# Altium footprint library Metric_Thru_Hole.PcbLib: 91 footprints (part 2 of 6)
Each footprint in its own frame and in the unit in brackets; x right, y up, seen from the top. Pads: shape width x height; smd on the part's side, far side on the other; paste and mask are expansions set on the pad; w line width, h text height; cw(c..) or ccw(c..) is an arc to the next point about the centre after c.
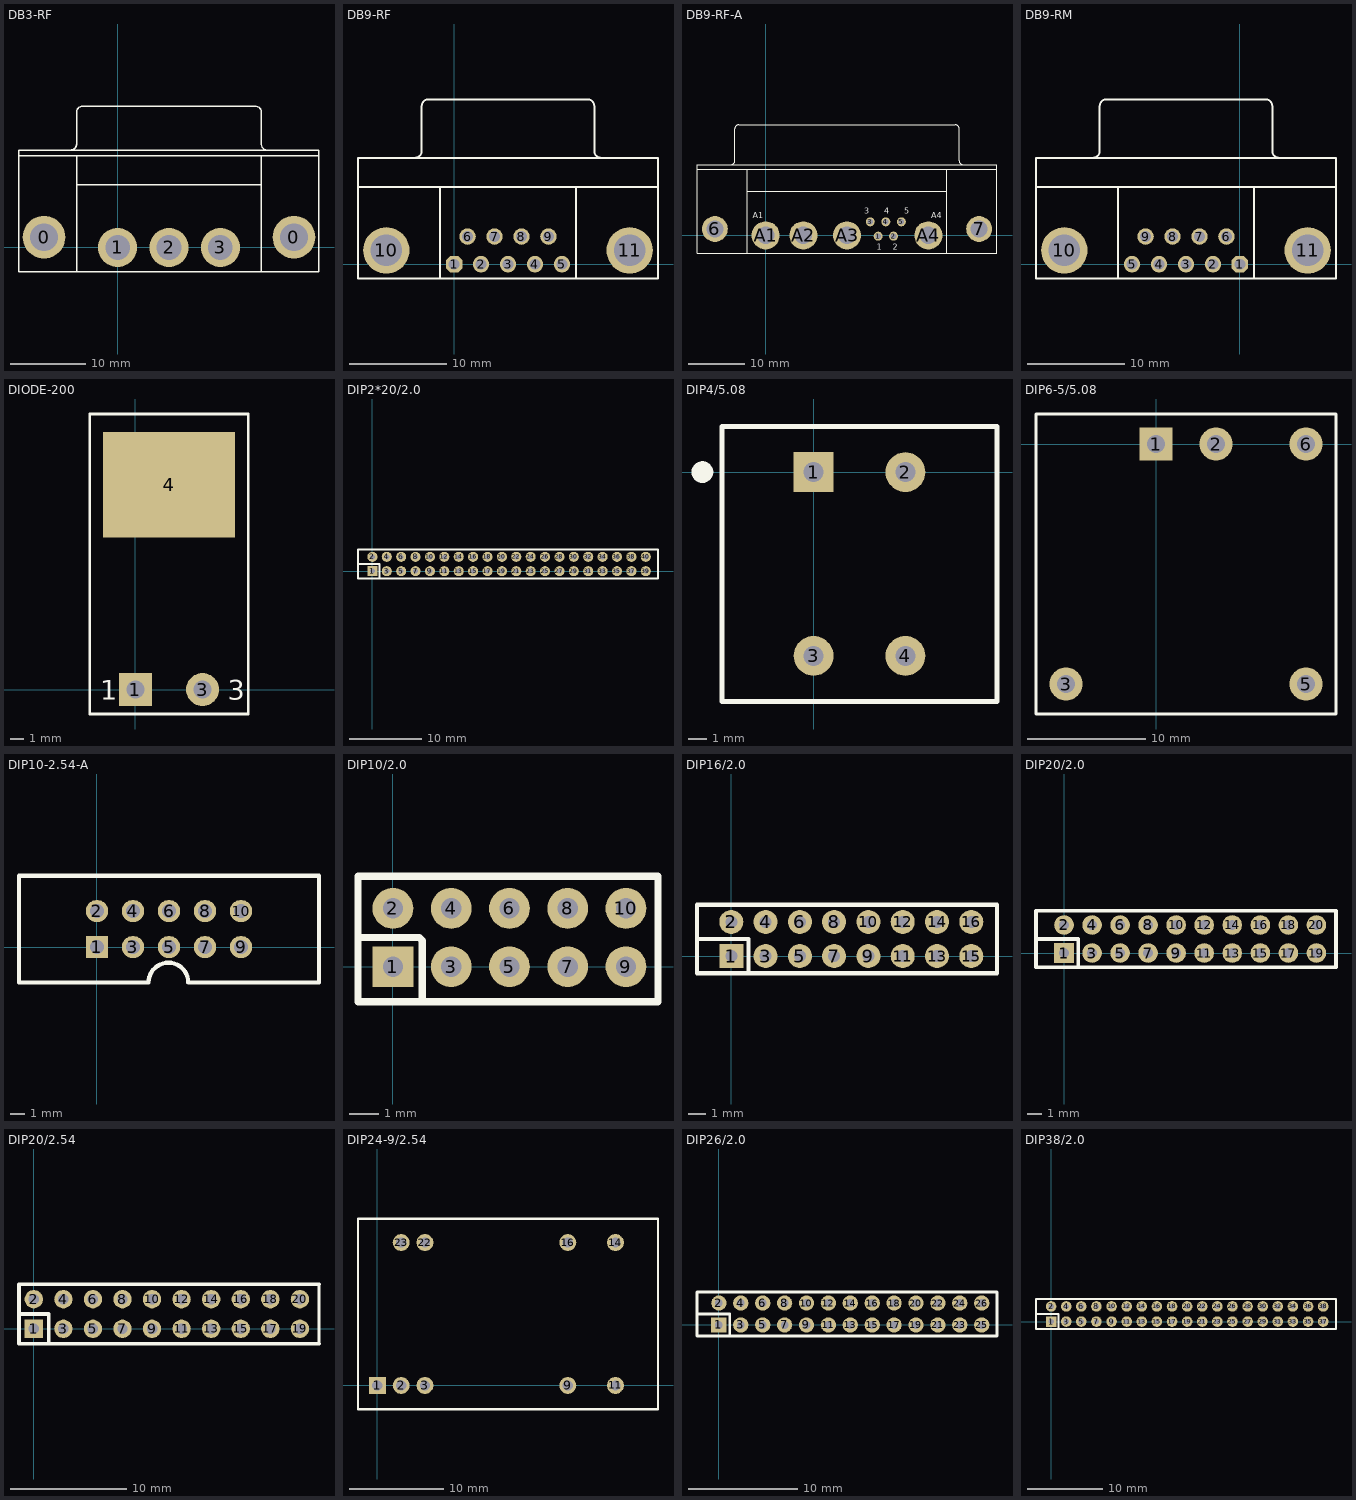
[diagram p1: the footprints below, top view; thin cyan lines are the x and y axes]

## DB3-RF [mm] "D-SUB 3W3 弯脚,母座，pitch 6.86mm,"
height 12.88
pads (5):
  round 5.7 hole 3.7: 0(-9.8,1.38) 0(23.52,1.38)
  round 5.2 hole 3.28: 1(0,0) 2(6.86,0) 3(13.72,0)
Top Overlay:
  lines w0.2: -13.14,12.2 26.86,12.2 ; -6.165,13.021 ccw(c-6.165,13.716) -5.47,13.716 -5.47,18.105 cw(c-4.775,18.105) -4.775,18.8 ; -5.47,-3.2 -5.47,12.192 ; -5.47,8.34 19.19,8.34 ; -4.824,18.8 18.495,18.8 cw(c18.495,18.105) 19.19,18.105 19.19,13.695 ccw(c19.885,13.695) 19.885,13 ; 19.19,-3.2 19.19,12.2 ; -13.14,-3.2 26.86,-3.2 26.86,13 -13.14,13 -13.14,-3.2

## DB9-RF [mm] "DB9 卧式间距1.385 mm,母头"
height 12.75
pads (11):
  oct 1.69x1.69 hole 1.09: 1(0,0)
  round 1.69 hole 1.09: 2(2.77,0) 3(5.54,0) 4(8.31,0) 5(11.08,0) 6(1.385,2.84) 7(4.155,2.84) 8(6.925,2.84) 9(9.695,2.84)
  round 4.76 hole 3.26: 10(-6.955,1.42) 11(18.035,1.42)
Top Overlay:
  lines w0.2: -9.86,7.92 20.94,7.92 ; -4.02,10.925 ccw(c-4.02,11.62) -3.325,11.62 -3.325,16.22 ; -3.32,16.225 cw(c-2.625,16.225) -2.625,16.92 13.705,16.92 cw(c13.705,16.225) 14.4,16.225 ; -1.46,-1.48 -1.46,7.92 ; 12.54,-1.48 12.54,7.92 ; 14.405,16.22 14.405,11.62 ccw(c15.1,11.62) 15.1,10.925 ; -9.86,-1.48 -9.86,10.92 20.94,10.92 20.94,-1.48 -9.86,-1.48
Bottom Overlay:
  text "8" at 7.137,4.115 h1
  text "7" at 4.343,4.064 h1
  text "4" at 8.661,-2.337 h1
  text "3" at 5.715,-2.286 h1
  text "2" at 2.946,-2.184 h1
  text "6" at 1.73,4.062 h1
  text "9" at 10.112,4.062 h1
  text "1" at 0,1.27 h1
  text "5" at 11.684,1.27 h1
3D body "SW3DPS-DB9RA_F-DEFAULT.STEP": height 12.55, standoff -3.5, extent -10.067,-1.636 21.243,16.764

## DB9-RF-A [mm] "DB9 卧式间距1.385 mm,母头"
height 12.75
pads (11):
  round 1.6 hole 1: 1(20.02,-0.14) 2(22.76,-0.14) 3(18.62,2.4) 4(21.39,2.4) 5(24.16,2.4)
  round 4.6 hole 3: 6(-9.04,1.13) 7(38,1.13)
  round 5 hole 3.15: A1(0,0) A2(6.71,0) A3(14.48,0) A4(28.96,0)
Top Overlay:
  lines w0.2: -12.22,11.8 41.18,11.8 ; -6.16,12.6 ccw(c-6.16,13.295) -5.465,13.295 -5.465,19.005 cw(c-4.77,19.005) -4.77,19.7 33.73,19.7 cw(c33.73,19.005) 34.425,19.005 34.425,13.295 ccw(c35.12,13.295) 35.12,12.6 ; -3.3,-3.2 -3.3,11.8 ; -3.3,7.874 32.26,7.874 ; 32.26,-3.2 32.26,11.8 ; -12.22,-3.2 41.18,-3.2 41.18,12.6 -12.22,12.6 -12.22,-3.2
  text "A4" at 29.464,3.048 h1.02
  text "A1" at -2.286,3.048 h1.02
  text "4" at 21.082,3.81 h1.02
  text "5" at 24.638,3.81 h1.02
  text "3" at 17.526,3.81 h1.02
  text "2" at 22.606,-2.54 h1.02
  text "1" at 19.812,-2.54 h1.02

## DB9-RM [mm] "DB9 卧式间距1.385 mm,公头"
height 12.75
pads (11):
  oct 1.69x1.69 hole 1.09: 1(0,0)
  round 1.69 hole 1.09: 2(-2.77,0) 3(-5.54,0) 4(-8.31,0) 5(-11.08,0) 6(-1.385,2.84) 7(-4.155,2.84) 8(-6.925,2.84) 9(-9.695,2.84)
  round 4.76 hole 3.26: 10(-18.035,1.42) 11(6.955,1.42)
Top Overlay:
  lines w0.2: -20.94,7.92 9.86,7.92 ; -15.1,10.925 ccw(c-15.1,11.62) -14.405,11.62 -14.405,16.22 ; -14.4,16.225 cw(c-13.705,16.225) -13.705,16.92 2.625,16.92 cw(c2.625,16.225) 3.32,16.225 ; -12.54,-1.48 -12.54,7.92 ; 1.46,-1.48 1.46,7.92 ; 3.325,16.22 3.325,11.62 ccw(c4.02,11.62) 4.02,10.925 ; -20.94,-1.48 -20.94,10.92 9.86,10.92 9.86,-1.48 -20.94,-1.48
Bottom Overlay:
  text "6" at -0.968,4.062 h1
  text "9" at -9.35,4.062 h1
  text "1" at 0.254,1.27 h1
  text "5" at -10.922,1.27 h1
  text "4" at -7.95,-2.286 h1
  text "3" at -5.283,-2.311 h1
  text "2" at -2.413,-2.311 h1
  text "7" at -3.988,4.062 h1
  text "8" at -6.756,4.062 h1
3D body "SW3DPS-DB9RA_M-DEFAULT.STEP": height 12.55, standoff -3.5, extent -21.245,-1.524 10.069,17.276

## DIODE-200 [mm]
height 4.82
pads (3):
  rect 2.5x2.5 hole 1.35: 1(0,0)
  round 2.5 hole 1.35: 3(5.08,0)
  rect 10x8 smd: 4(2.54,15.5)
Top Overlay:
  lines w0.2: -3.46,-1.85 -3.46,2.85 -3.46,20.859 8.54,20.859 8.54,2.85 8.54,-1.85 7.112,-1.85 -1.905,-1.85 -3.46,-1.85
  text "3" at 6.985,-0.762 h1.5
  text "1" at -2.667,-0.762 h1.5

## DIP2*20/2.0 [mm]
pads (40):
  rect 1.4x1.4 hole 0.7: 1(0,0)
  round 1.4 hole 0.7: 2(0,2) 3(2,0) 4(2,2) 5(4,0) 6(4,2) 7(6,0) 8(6,2) 9(8,0) 10(8,2) 11(10,0) 12(10,2) 13(12,0) 14(12,2) 15(14,0) 16(14,2) 17(16,0) 18(16,2) 19(18,0) 20(18,2) 21(20,0) 22(20,2) 23(22,0) 24(22,2) 25(24,0) 26(24,2) 27(26,0) 28(26,2) 29(28,0) 30(28,2) 31(30,0) 32(30,2) 33(32,0) 34(32,2) 35(34,0) 36(34,2) 37(36,0) 38(36,2) 39(38,0) 40(38,2)
Top Overlay:
  lines w0.254: -2,1 1,1 1,-1 ; -2,-1 -2,3 39.7,3 39.7,-1 -2,-1
3D body: height 5.59, standoff 0.51, extent 37.748,-0.253 38.255,0.252
3D body: height 1.02, standoff 0, extent 36.73,-1.27 39.265,1.26
3D body: height 1.02, standoff 0, extent 36.73,0.762 39.265,3.292
3D body: height 5.59, standoff 0.51, extent 37.748,1.779 38.255,2.284
3D body: height 5.59, standoff 0.51, extent 35.748,-0.253 36.255,0.252
3D body: height 1.02, standoff 0, extent 34.73,-1.27 37.265,1.26
3D body: height 1.02, standoff 0, extent 34.73,0.762 37.265,3.292
3D body: height 5.59, standoff 0.51, extent 35.748,1.779 36.255,2.284
3D body: height 5.59, standoff 0.51, extent 33.748,-0.253 34.255,0.252
3D body: height 1.02, standoff 0, extent 32.73,-1.27 35.265,1.26
3D body: height 1.02, standoff 0, extent 32.73,0.762 35.265,3.292
3D body: height 5.59, standoff 0.51, extent 33.748,1.779 34.255,2.284
3D body: height 5.59, standoff 0.51, extent 31.748,-0.253 32.255,0.252
3D body: height 1.02, standoff 0, extent 30.73,-1.27 33.265,1.26
3D body: height 1.02, standoff 0, extent 30.73,0.762 33.265,3.292
3D body: height 5.59, standoff 0.51, extent 31.748,1.779 32.255,2.284
3D body: height 5.59, standoff 0.51, extent 29.748,-0.253 30.255,0.252
3D body: height 1.02, standoff 0, extent 28.73,-1.27 31.265,1.26
3D body: height 1.02, standoff 0, extent 28.73,0.762 31.265,3.292
3D body: height 5.59, standoff 0.51, extent 29.748,1.779 30.255,2.284
3D body: height 5.59, standoff 0.51, extent 27.748,-0.253 28.255,0.252
3D body: height 1.02, standoff 0, extent 26.73,-1.27 29.265,1.26
3D body: height 1.02, standoff 0, extent 26.73,0.762 29.265,3.292
3D body: height 5.59, standoff 0.51, extent 27.748,1.779 28.255,2.284
3D body: height 5.59, standoff 0.51, extent 25.748,-0.253 26.255,0.252
3D body: height 1.02, standoff 0, extent 24.73,-1.27 27.265,1.26
3D body: height 1.02, standoff 0, extent 24.73,0.762 27.265,3.292
3D body: height 5.59, standoff 0.51, extent 25.748,1.779 26.255,2.284
3D body: height 5.59, standoff 0.51, extent 23.748,-0.253 24.255,0.252
3D body: height 1.02, standoff 0, extent 22.73,-1.27 25.265,1.26
3D body: height 1.02, standoff 0, extent 22.73,0.762 25.265,3.292
3D body: height 5.59, standoff 0.51, extent 23.748,1.779 24.255,2.284
3D body: height 5.59, standoff 0.51, extent 21.748,-0.253 22.255,0.252
3D body: height 1.02, standoff 0, extent 20.73,-1.27 23.265,1.26
3D body: height 1.02, standoff 0, extent 20.73,0.762 23.265,3.292
3D body: height 5.59, standoff 0.51, extent 21.748,1.779 22.255,2.284
3D body: height 5.59, standoff 0.51, extent 19.748,-0.253 20.255,0.252
3D body: height 1.02, standoff 0, extent 18.73,-1.27 21.265,1.26
3D body: height 1.02, standoff 0, extent 18.73,0.762 21.265,3.292
3D body: height 5.59, standoff 0.51, extent 19.748,1.779 20.255,2.284
3D body: height 5.59, standoff 0.51, extent 17.748,-0.253 18.255,0.252
3D body: height 1.02, standoff 0, extent 16.73,-1.27 19.265,1.26
3D body: height 1.02, standoff 0, extent 16.73,0.762 19.265,3.292
3D body: height 5.59, standoff 0.51, extent 17.748,1.779 18.255,2.284
3D body: height 5.59, standoff 0.51, extent 15.748,-0.253 16.255,0.252
3D body: height 1.02, standoff 0, extent 14.73,-1.27 17.265,1.26
3D body: height 1.02, standoff 0, extent 14.73,0.762 17.265,3.292
3D body: height 5.59, standoff 0.51, extent 15.748,1.779 16.255,2.284
3D body: height 5.59, standoff 0.51, extent 13.748,-0.253 14.255,0.252
3D body: height 1.02, standoff 0, extent 12.73,-1.27 15.265,1.26
3D body: height 1.02, standoff 0, extent 12.73,0.762 15.265,3.292
3D body: height 5.59, standoff 0.51, extent 13.748,1.779 14.255,2.284
3D body: height 5.59, standoff 0.51, extent 11.748,-0.253 12.255,0.252
3D body: height 1.02, standoff 0, extent 10.73,-1.27 13.265,1.26
3D body: height 1.02, standoff 0, extent 10.73,0.762 13.265,3.292
3D body: height 5.59, standoff 0.51, extent 11.748,1.779 12.255,2.284
3D body: height 5.59, standoff 0.51, extent 9.748,-0.253 10.255,0.252
3D body: height 1.02, standoff 0, extent 8.73,-1.27 11.265,1.26
3D body: height 1.02, standoff 0, extent 8.73,0.762 11.265,3.292
3D body: height 5.59, standoff 0.51, extent 9.748,1.779 10.255,2.284
3D body: height 5.59, standoff 0.51, extent 7.748,-0.253 8.255,0.252
3D body: height 1.02, standoff 0, extent 6.73,-1.27 9.265,1.26
3D body: height 1.02, standoff 0, extent 6.73,0.762 9.265,3.292
3D body: height 5.59, standoff 0.51, extent 7.748,1.779 8.255,2.284
3D body: height 5.59, standoff 0.51, extent 5.748,-0.253 6.255,0.252
3D body: height 1.02, standoff 0, extent 4.73,-1.27 7.265,1.26
3D body: height 1.02, standoff 0, extent 4.73,0.762 7.265,3.292
3D body: height 5.59, standoff 0.51, extent 5.748,1.779 6.255,2.284
3D body: height 5.59, standoff 0.51, extent 3.748,-0.253 4.255,0.252
3D body: height 1.02, standoff 0, extent 2.73,-1.27 5.265,1.26
3D body: height 1.02, standoff 0, extent 2.73,0.762 5.265,3.292
3D body: height 5.59, standoff 0.51, extent 3.748,1.779 4.255,2.284
3D body: height 5.59, standoff 0.51, extent 1.748,-0.253 2.255,0.252
3D body: height 1.02, standoff 0, extent 0.73,-1.27 3.265,1.26
3D body: height 1.02, standoff 0, extent 0.73,0.762 3.265,3.292
3D body: height 5.59, standoff 0.51, extent 1.748,1.779 2.255,2.284
3D body: height 5.59, standoff 0.51, extent -0.252,-0.253 0.255,0.252
3D body: height 1.02, standoff 0, extent -1.27,-1.27 1.265,1.26
3D body: height 1.02, standoff 0, extent -1.27,0.762 1.265,3.292
3D body: height 5.59, standoff 0.51, extent -0.252,1.779 0.255,2.284

## DIP4/5.08 [mm] "lcm"
height 11
pads (4):
  rect 2.2x2.2 hole 1.1: 1(0,0)
  round 2.2 hole 1.1: 2(5.08,0) 3(0,-10.16) 4(5.08,-10.16)
Top Overlay:
  circle w0.6: c-6.142,0 r0.3
  lines w0.254: -5.06,-12.68 10.14,-12.68 10.14,2.52 -5.06,2.52 -5.06,-12.68

## DIP6-5/5.08 [mm]
height 11.7
pads (5):
  rect 2.8x2.8 hole 1.5: 1(0,0)
  round 2.8 hole 1.5: 2(5.08,0) 3(-7.62,-20.32) 5(12.7,-20.32) 6(12.7,0)
Top Overlay:
  lines w0.254: -10.16,-22.86 -10.16,2.54 15.24,2.54 15.24,-22.86 -10.16,-22.86

## DIP10-2.54-A [mil]
pads (10):
  rect 62x62 hole 39.37: 1(0,0)
  round 62 hole 39.37: 2(0,100) 3(100,0) 4(100,100) 5(200,0) 6(200,100) 7(300,0) 8(300,100) 9(400,0) 10(400,100)
Top Overlay:
  lines w12: 614.17,198.43 -216.53,198.43 -216.53,-98.42 143.31,-98.42 cw(c198.43,-98.42) 253.54,-98.42 616.53,-98.42 616.53,198.43

## DIP10/2.0 [mm] "间距2.0插针,焊盘:外径1.4mm.孔径0.7mm"
height 5
pads (10):
  rect 1.4x1.4 hole 0.7: 1(0,0)
  round 1.4 hole 0.7: 2(0,2) 3(2,0) 4(2,2) 5(4,0) 6(4,2) 7(6,0) 8(6,2) 9(8,0) 10(8,2)
Top Overlay:
  lines w0.254: -1.2,1 0.9,1 1,0.9 1,-1.2 ; -1.2,-1.2 -1.2,3.1 9.1,3.1 9.1,-1.2 -1.2,-1.2
3D body: height 5.59, standoff 0.51, extent -0.252,1.779 0.254,2.285
3D body: height 5.59, standoff 0.51, extent 1.78,1.779 2.286,2.285
3D body: height 5.59, standoff 0.51, extent 3.812,1.779 4.318,2.285
3D body: height 5.59, standoff 0.51, extent 5.844,1.779 6.35,2.285
3D body: height 5.59, standoff 0.51, extent 7.622,1.779 8.128,2.285
3D body: height 5.59, standoff 0.51, extent 7.876,-0.253 8.382,0.253
3D body: height 5.59, standoff 0.51, extent 5.844,-0.253 6.35,0.253
3D body: height 5.59, standoff 0.51, extent 3.812,-0.253 4.318,0.253
3D body: height 5.59, standoff 0.51, extent 1.78,-0.253 2.286,0.253
3D body: height 1.02, standoff 0, extent -1.27,0.762 1.26,3.297
3D body: height 1.02, standoff 0, extent 0.762,0.762 3.292,3.297
3D body: height 1.02, standoff 0, extent 2.794,0.762 5.324,3.297
3D body: height 1.02, standoff 0, extent 4.826,0.762 7.356,3.297
3D body: height 1.02, standoff 0, extent 6.858,0.762 9.388,3.297
3D body: height 1.02, standoff 0, extent 6.604,-1.27 9.134,1.265
3D body: height 1.02, standoff 0, extent 4.826,-1.27 7.356,1.265
3D body: height 1.02, standoff 0, extent 2.794,-1.27 5.324,1.265
3D body: height 1.02, standoff 0, extent 0.762,-1.27 3.292,1.265
3D body: height 1.02, standoff 0, extent -1.27,-1.27 1.26,1.265
3D body: height 5.59, standoff 0.51, extent -0.252,-0.253 0.254,0.253

## DIP16/2.0 [mm] "间距2.0插针,焊盘:外径1.4mm.孔径0.7mm"
height 5
pads (16):
  rect 1.4x1.4 hole 0.7: 1(0,0)
  round 1.4 hole 0.7: 2(0,2) 3(2,0) 4(2,2) 5(4,0) 6(4,2) 7(6,0) 8(6,2) 9(8,0) 10(8,2) 11(10,0) 12(10,2) 13(12,0) 14(12,2) 15(14,0) 16(14,2)
Top Overlay:
  lines w0.254: -2,1 1,1 1,-1 ; -2,-1 -2,3 15.5,3 15.5,-1 -2,-1
3D body: height 1.02, standoff 0, extent -1.27,-1.27 1.26,1.265
3D body: height 5.59, standoff 0.51, extent -0.252,-0.253 0.254,0.253
3D body: height 1.02, standoff 0, extent 0.73,-1.27 3.26,1.265
3D body: height 5.59, standoff 0.51, extent 1.748,-0.253 2.254,0.253
3D body: height 1.02, standoff 0, extent 2.73,-1.27 5.26,1.265
3D body: height 5.59, standoff 0.51, extent 3.748,-0.253 4.254,0.253
3D body: height 1.02, standoff 0, extent 4.73,-1.27 7.26,1.265
3D body: height 5.59, standoff 0.51, extent 5.748,-0.253 6.254,0.253
3D body: height 1.02, standoff 0, extent 6.73,-1.27 9.26,1.265
3D body: height 5.59, standoff 0.51, extent 7.748,-0.253 8.254,0.253
3D body: height 1.02, standoff 0, extent 8.73,-1.27 11.26,1.265
3D body: height 5.59, standoff 0.51, extent 9.748,-0.253 10.254,0.253
3D body: height 1.02, standoff 0, extent 10.73,-1.27 13.26,1.265
3D body: height 5.59, standoff 0.51, extent 11.748,-0.253 12.254,0.253
3D body: height 1.02, standoff 0, extent 12.73,-1.27 15.26,1.265
3D body: height 5.59, standoff 0.51, extent 13.748,-0.253 14.254,0.253
3D body: height 1.02, standoff 0, extent 12.73,0.73 15.26,3.265
3D body: height 5.59, standoff 0.51, extent 13.748,1.747 14.254,2.254
3D body: height 1.02, standoff 0, extent 10.73,0.73 13.26,3.265
3D body: height 5.59, standoff 0.51, extent 11.748,1.747 12.254,2.254
3D body: height 1.02, standoff 0, extent 8.73,0.73 11.26,3.265
3D body: height 5.59, standoff 0.51, extent 9.748,1.747 10.254,2.254
3D body: height 1.02, standoff 0, extent 6.73,0.73 9.26,3.265
3D body: height 5.59, standoff 0.51, extent 7.748,1.747 8.254,2.254
3D body: height 1.02, standoff 0, extent 4.73,0.73 7.26,3.265
3D body: height 5.59, standoff 0.51, extent 5.748,1.747 6.254,2.254
3D body: height 1.02, standoff 0, extent 2.73,0.73 5.26,3.265
3D body: height 5.59, standoff 0.51, extent 3.748,1.747 4.254,2.254
3D body: height 1.02, standoff 0, extent 0.73,0.73 3.26,3.265
3D body: height 5.59, standoff 0.51, extent 1.748,1.747 2.254,2.254
3D body: height 1.02, standoff 0, extent -1.27,0.73 1.26,3.265
3D body: height 5.59, standoff 0.51, extent -0.252,1.747 0.254,2.254

## DIP20/2.0 [mm] "间距2.0插针,焊盘:外径1.4mm.孔径0.7mm"
height 5
pads (20):
  rect 1.4x1.4 hole 0.7: 1(0,0)
  round 1.4 hole 0.7: 2(0,2) 3(2,0) 4(2,2) 5(4,0) 6(4,2) 7(6,0) 8(6,2) 9(8,0) 10(8,2) 11(10,0) 12(10,2) 13(12,0) 14(12,2) 15(14,0) 16(14,2) 17(16,0) 18(16,2) 19(18,0) 20(18,2)
Top Overlay:
  lines w0.254: -2,1 1,1 1,-1 ; -2,-1 19.4,-1 19.4,3 -2,3 -2,-1
3D body: height 5.59, standoff 0.51, extent -0.252,-0.253 0.254,0.253
3D body: height 1.02, standoff 0, extent -1.27,-1.27 1.26,1.265
3D body: height 5.59, standoff 0.51, extent 1.748,-0.253 2.254,0.253
3D body: height 1.02, standoff 0, extent 0.73,-1.27 3.26,1.265
3D body: height 5.59, standoff 0.51, extent 3.748,-0.253 4.254,0.253
3D body: height 1.02, standoff 0, extent 2.73,-1.27 5.26,1.265
3D body: height 5.59, standoff 0.51, extent 5.748,-0.253 6.254,0.253
3D body: height 1.02, standoff 0, extent 4.73,-1.27 7.26,1.265
3D body: height 5.59, standoff 0.51, extent 7.748,-0.253 8.254,0.253
3D body: height 1.02, standoff 0, extent 6.73,-1.27 9.26,1.265
3D body: height 5.59, standoff 0.51, extent 9.748,-0.253 10.254,0.253
3D body: height 1.02, standoff 0, extent 8.73,-1.27 11.26,1.265
3D body: height 5.59, standoff 0.51, extent 11.748,-0.253 12.254,0.253
3D body: height 1.02, standoff 0, extent 10.73,-1.27 13.26,1.265
3D body: height 5.59, standoff 0.51, extent 13.748,-0.253 14.254,0.253
3D body: height 1.02, standoff 0, extent 12.73,-1.27 15.26,1.265
3D body: height 5.59, standoff 0.51, extent 15.748,-0.253 16.254,0.253
3D body: height 1.02, standoff 0, extent 14.73,-1.27 17.26,1.265
3D body: height 5.59, standoff 0.51, extent 17.748,-0.253 18.254,0.253
3D body: height 1.02, standoff 0, extent 16.73,-1.27 19.26,1.265
3D body: height 5.59, standoff 0.51, extent 17.748,1.747 18.254,2.254
3D body: height 1.02, standoff 0, extent 16.73,0.73 19.26,3.265
3D body: height 5.59, standoff 0.51, extent 15.748,1.747 16.254,2.254
3D body: height 1.02, standoff 0, extent 14.73,0.73 17.26,3.265
3D body: height 5.59, standoff 0.51, extent 13.748,1.747 14.254,2.254
3D body: height 1.02, standoff 0, extent 12.73,0.73 15.26,3.265
3D body: height 5.59, standoff 0.51, extent 11.748,1.747 12.254,2.254
3D body: height 1.02, standoff 0, extent 10.73,0.73 13.26,3.265
3D body: height 5.59, standoff 0.51, extent 9.748,1.747 10.254,2.254
3D body: height 1.02, standoff 0, extent 8.73,0.73 11.26,3.265
3D body: height 5.59, standoff 0.51, extent 7.748,1.747 8.254,2.254
3D body: height 1.02, standoff 0, extent 6.73,0.73 9.26,3.265
3D body: height 5.59, standoff 0.51, extent 5.748,1.747 6.254,2.254
3D body: height 1.02, standoff 0, extent 4.73,0.73 7.26,3.265
3D body: height 5.59, standoff 0.51, extent 3.748,1.747 4.254,2.254
3D body: height 1.02, standoff 0, extent 2.73,0.73 5.26,3.265
3D body: height 5.59, standoff 0.51, extent 1.748,1.747 2.254,2.254
3D body: height 1.02, standoff 0, extent 0.73,0.73 3.26,3.265
3D body: height 5.59, standoff 0.51, extent -0.252,1.747 0.254,2.254
3D body: height 1.02, standoff 0, extent -1.27,0.73 1.26,3.265

## DIP20/2.54 [mil] "2.54间距插针, 焊盘:外径1.57mm.孔径0.9mm"
height 314.96
pads (20):
  rect 62x62 hole 35.43: 1(0,0)
  round 62 hole 35.43: 2(0,100) 3(100,0) 4(100,100) 5(200,0) 6(200,100) 7(300,0) 8(300,100) 9(400,0) 10(400,100) 11(500,0) 12(500,100) 13(600,0) 14(600,100) 15(700,0) 16(700,100) 17(800,0) 18(800,100) 19(900,0) 20(900,100)
Top Overlay:
  lines w10: 964.57,-50 964.57,150
  lines w12: -50,50 50,50 50,-50 ; 964.57,-50 -50,-50 -50,150 964.57,150
3D body: height 40, standoff 0, extent 850,-50 949.61,49.8
3D body: height 220, standoff 20, extent 890.08,-9.98 910,9.98
3D body: height 40, standoff 0, extent 850,50 949.61,149.8
3D body: height 220, standoff 20, extent 890.08,90.02 910,109.98
3D body: height 40, standoff 0, extent 750,-50 849.61,49.8
3D body: height 220, standoff 20, extent 790.08,-9.98 810,9.98
3D body: height 40, standoff 0, extent 750,50 849.61,149.8
3D body: height 220, standoff 20, extent 790.08,90.02 810,109.98
3D body: height 40, standoff 0, extent 650,-50 749.61,49.8
3D body: height 220, standoff 20, extent 690.08,-9.98 710,9.98
3D body: height 40, standoff 0, extent 650,50 749.61,149.8
3D body: height 220, standoff 20, extent 690.08,90.02 710,109.98
3D body: height 40, standoff 0, extent 550,-50 649.61,49.8
3D body: height 220, standoff 20, extent 590.08,-9.98 610,9.98
3D body: height 40, standoff 0, extent 550,50 649.61,149.8
3D body: height 220, standoff 20, extent 590.08,90.02 610,109.98
3D body: height 40, standoff 0, extent 450,50 549.61,149.8
3D body: height 220, standoff 20, extent 490.08,90.02 510,109.98
3D body: height 40, standoff 0, extent 450,-50 549.61,49.8
3D body: height 220, standoff 20, extent 490.08,-9.98 510,9.98
3D body: height 40, standoff 0, extent 350,-50 449.61,49.8
3D body: height 220, standoff 20, extent 390.08,-9.98 410,9.98
3D body: height 40, standoff 0, extent 350,50 449.61,149.8
3D body: height 220, standoff 20, extent 390.08,90.02 410,109.98
3D body: height 40, standoff 0, extent 250,50 349.61,149.8
3D body: height 220, standoff 20, extent 290.08,90.02 310,109.98
3D body: height 40, standoff 0, extent 150,50 249.61,149.8
3D body: height 220, standoff 20, extent 190.08,90.02 210,109.98
3D body: height 40, standoff 0, extent 50,50 149.61,149.8
3D body: height 220, standoff 20, extent 90.08,90.02 110,109.98
3D body: height 40, standoff 0, extent -50,50 49.61,149.8
3D body: height 220, standoff 20, extent -9.92,90.02 10,109.98
3D body: height 40, standoff 0, extent 250,-50 349.61,49.8
3D body: height 220, standoff 20, extent 290.08,-9.98 310,9.98
3D body: height 40, standoff 0, extent 150,-50 249.61,49.8
3D body: height 220, standoff 20, extent 190.08,-9.98 210,9.98
3D body: height 40, standoff 0, extent 50,-50 149.61,49.8
3D body: height 220, standoff 20, extent 90.08,-9.98 110,9.98
3D body: height 40, standoff 0, extent -50,-50 49.61,49.8
3D body: height 220, standoff 20, extent -9.92,-9.98 10,9.98

## DIP24-9/2.54 [mm]
height 10.2
pads (9):
  rect 1.8x1.8 hole 1.1: 1(0,0)
  round 1.8 hole 1.1: 2(2.54,0) 3(5.08,0) 9(20.32,0) 11(25.4,0) 14(25.4,15.24) 16(20.32,15.24) 22(5.08,15.24) 23(2.54,15.24)
Top Overlay:
  lines w0.254: -2.06,-2.54 29.94,-2.54 29.94,17.78 -2.06,17.78 -2.06,-2.54
3D body: height 10.79, standoff 0, extent -2.06,-2.54 29.94,17.78
3D body: height 10.82, standoff 0, extent 0.508,10.16 17.526,13.208
3D body: height 10.82, standoff 0, extent 0.508,4.064 8.636,5.842

## DIP26/2.0 [mm] "间距2.0插针,焊盘:外径1.4mm.孔径0.7mm"
height 5
pads (26):
  rect 1.4x1.4 hole 0.7: 1(0,0)
  round 1.4 hole 0.7: 2(0,2) 3(2,0) 4(2,2) 5(4,0) 6(4,2) 7(6,0) 8(6,2) 9(8,0) 10(8,2) 11(10,0) 12(10,2) 13(12,0) 14(12,2) 15(14,0) 16(14,2) 17(16,0) 18(16,2) 19(18,0) 20(18,2) 21(20,0) 22(20,2) 23(22,0) 24(22,2) 25(24,0) 26(24,2)
Top Overlay:
  lines w0.254: -2,1 1,1 1,-1 ; -2,-1 -2,3 25.4,3 25.4,-1 -2,-1
3D body: height 5.08, standoff 0, extent 19.697,1.7 20.203,2.207
3D body: height 3.54, standoff 2.54, extent 18.635,0.65 21.165,3.185
3D body: height 3.54, standoff 2.54, extent 20.685,0.65 23.215,3.185
3D body: height 5.08, standoff 0, extent 21.747,1.7 22.253,2.207
3D body: height 3.54, standoff 2.54, extent 22.635,0.65 25.165,3.185
3D body: height 5.08, standoff 0, extent 23.697,1.7 24.203,2.207
3D body: height 5.08, standoff 0, extent 9.697,1.7 10.203,2.207
3D body: height 3.54, standoff 2.54, extent 8.635,0.65 11.165,3.185
3D body: height 3.54, standoff 2.54, extent 10.685,0.65 13.215,3.185
3D body: height 5.08, standoff 0, extent 11.747,1.7 12.253,2.207
3D body: height 3.54, standoff 2.54, extent 12.635,0.65 15.165,3.185
3D body: height 5.08, standoff 0, extent 13.697,1.7 14.203,2.207
3D body: height 3.54, standoff 2.54, extent 14.685,0.65 17.215,3.185
3D body: height 5.08, standoff 0, extent 15.747,1.7 16.253,2.207
3D body: height 3.54, standoff 2.54, extent 16.57,0.633 19.1,3.167
3D body: height 5.08, standoff 0, extent 17.694,1.746 18.2,2.253
3D body: height 5.08, standoff 0, extent -0.303,1.7 0.203,2.207
3D body: height 3.54, standoff 2.54, extent -1.365,0.65 1.165,3.185
3D body: height 3.54, standoff 2.54, extent 0.685,0.65 3.215,3.185
3D body: height 5.08, standoff 0, extent 1.747,1.7 2.253,2.207
3D body: height 3.54, standoff 2.54, extent 2.635,0.65 5.165,3.185
3D body: height 5.08, standoff 0, extent 3.697,1.7 4.203,2.207
3D body: height 3.54, standoff 2.54, extent 4.685,0.65 7.215,3.185
3D body: height 5.08, standoff 0, extent 5.747,1.7 6.253,2.207
3D body: height 3.54, standoff 2.54, extent 6.57,0.633 9.1,3.167
3D body: height 5.08, standoff 0, extent 7.694,1.746 8.2,2.253
3D body: height 5.08, standoff 0, extent 19.697,-0.3 20.203,0.207
3D body: height 3.54, standoff 2.54, extent 18.635,-1.35 21.165,1.185
3D body: height 3.54, standoff 2.54, extent 20.685,-1.35 23.215,1.185
3D body: height 5.08, standoff 0, extent 21.747,-0.3 22.253,0.207
3D body: height 3.54, standoff 2.54, extent 22.635,-1.35 25.165,1.185
3D body: height 5.08, standoff 0, extent 23.697,-0.3 24.203,0.207
3D body: height 5.08, standoff 0, extent 9.697,-0.3 10.203,0.207
3D body: height 3.54, standoff 2.54, extent 8.635,-1.35 11.165,1.185
3D body: height 3.54, standoff 2.54, extent 10.685,-1.35 13.215,1.185
3D body: height 5.08, standoff 0, extent 11.747,-0.3 12.253,0.207
3D body: height 3.54, standoff 2.54, extent 12.635,-1.35 15.165,1.185
3D body: height 5.08, standoff 0, extent 13.697,-0.3 14.203,0.207
3D body: height 3.54, standoff 2.54, extent 14.685,-1.35 17.215,1.185
3D body: height 5.08, standoff 0, extent 15.747,-0.3 16.253,0.207
3D body: height 3.54, standoff 2.54, extent 16.57,-1.367 19.1,1.167
3D body: height 5.08, standoff 0, extent 17.694,-0.253 18.2,0.253
3D body: height 5.08, standoff 0, extent 7.694,-0.253 8.2,0.253
3D body: height 3.54, standoff 2.54, extent 6.57,-1.367 9.1,1.167
3D body: height 5.08, standoff 0, extent 5.747,-0.3 6.253,0.207
3D body: height 3.54, standoff 2.54, extent 4.685,-1.35 7.215,1.185
3D body: height 5.08, standoff 0, extent 3.697,-0.3 4.203,0.207
3D body: height 3.54, standoff 2.54, extent 2.635,-1.35 5.165,1.185
3D body: height 5.08, standoff 0, extent 1.747,-0.3 2.253,0.207
3D body: height 3.54, standoff 2.54, extent 0.685,-1.35 3.215,1.185
3D body: height 3.54, standoff 2.54, extent -1.365,-1.35 1.165,1.185
3D body: height 5.08, standoff 0, extent -0.303,-0.3 0.203,0.207

## DIP38/2.0 [mm] "间距2.0插针,焊盘:外径1.4mm.孔径0.7mm"
height 5
pads (38):
  rect 1.4x1.4 hole 0.7: 1(0,0)
  round 1.4 hole 0.7: 2(0,2) 3(2,0) 4(2,2) 5(4,0) 6(4,2) 7(6,0) 8(6,2) 9(8,0) 10(8,2) 11(10,0) 12(10,2) 13(12,0) 14(12,2) 15(14,0) 16(14,2) 17(16,0) 18(16,2) 19(18,0) 20(18,2) 21(20,0) 22(20,2) 23(22,0) 24(22,2) 25(24,0) 26(24,2) 27(26,0) 28(26,2) 29(28,0) 30(28,2) 31(30,0) 32(30,2) 33(32,0) 34(32,2) 35(34,0) 36(34,2) 37(36,0) 38(36,2)
Top Overlay:
  lines w0.254: -2,1 1,1 1,-1 ; -2,-1 37.7,-1 37.7,3 -2,3 -2,-1